# Altium footprint library FootprintSMD.PcbLib: 140 footprints (part 5 of 9)
Each footprint in its own frame and in the unit in brackets; x right, y up, seen from the top. Pads: shape width x height; smd on the part's side, far side on the other; paste and mask are expansions set on the pad; w line width, h text height; cw(c..) or ccw(c..) is an arc to the next point about the centre after c.
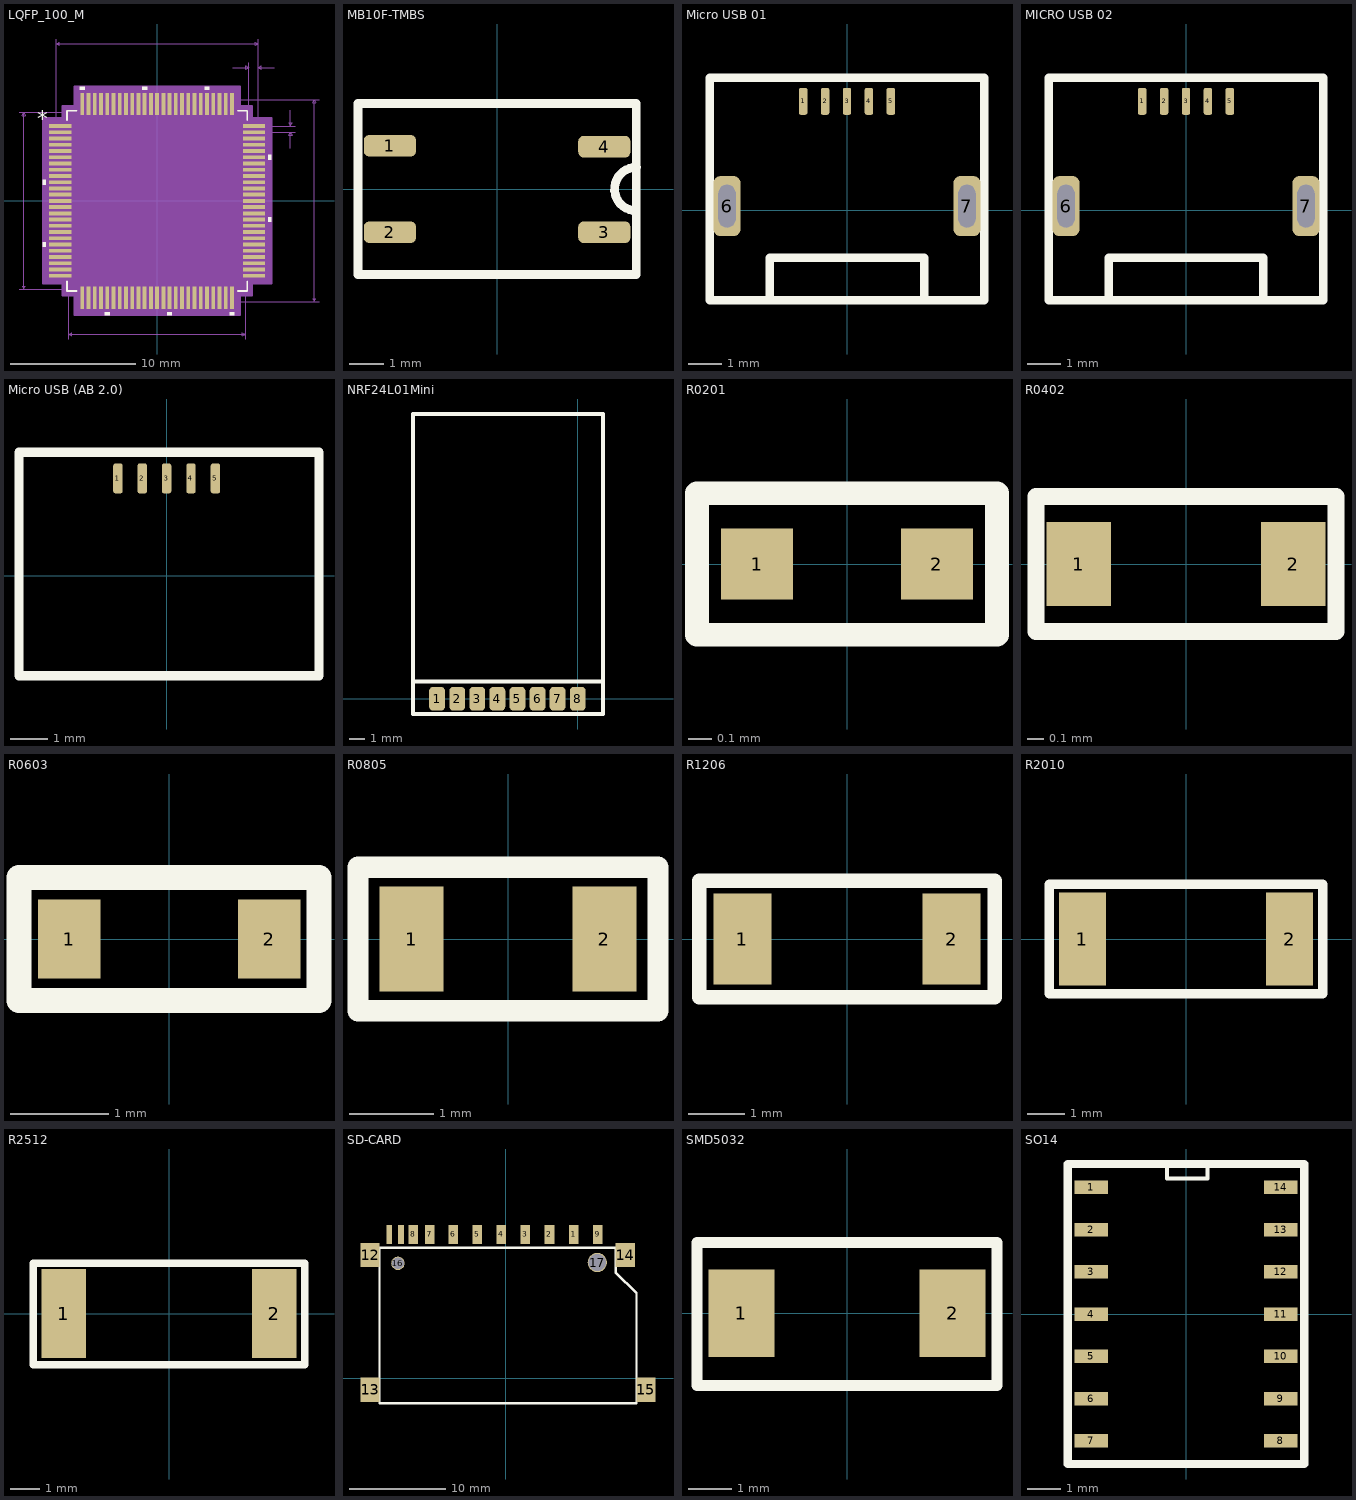
[diagram p4: the footprints below, top view; thin cyan lines are the x and y axes]

## LQFP_100_M [mil]
pads (100):
  rect 70x12 smd paste+0 mask+0: 1(-306,236.22) 2(-306,216.54) 3(-306,196.85) 4(-306,177.17) 5(-306,157.48) 6(-306,137.8) 7(-306,118.11) 8(-306,98.43) 9(-306,78.74) 10(-306,59.06) 11(-306,39.37) 12(-306,19.69) 13(-306,0) 14(-306,-19.68) 15(-306,-39.37) 16(-306,-59.06) 17(-306,-78.74) 18(-306,-98.43) 19(-306,-118.11) 20(-306,-137.8) 21(-306,-157.48) 22(-306,-177.17) 23(-306,-196.85) 24(-306,-216.54) 25(-306,-236.22) 51(306,-236.22) 52(306,-216.54) 53(306,-196.85) 54(306,-177.17) 55(306,-157.48) 56(306,-137.8) 57(306,-118.11) 58(306,-98.43) 59(306,-78.74) 60(306,-59.06) 61(306,-39.37) 62(306,-19.68) 63(306,0) 64(306,19.68) 65(306,39.37) 66(306,59.06) 67(306,78.74) 68(306,98.43) 69(306,118.11) 70(306,137.8) 71(306,157.48) 72(306,177.17) 73(306,196.85) 74(306,216.54) 75(306,236.22)
  rect 12x70 smd paste+0 mask+0: 26(-236.22,-306) 27(-216.54,-306) 28(-196.85,-306) 29(-177.17,-306) 30(-157.48,-306) 31(-137.8,-306) 32(-118.11,-306) 33(-98.43,-306) 34(-78.74,-306) 35(-59.06,-306) 36(-39.37,-306) 37(-19.68,-306) 38(0,-306) 39(19.68,-306) 40(39.37,-306) 41(59.06,-306) 42(78.74,-306) 43(98.43,-306) 44(118.11,-306) 45(137.8,-306) 46(157.48,-306) 47(177.17,-306) 48(196.85,-306) 49(216.54,-306) 50(236.22,-306) 76(236.22,306) 77(216.54,306) 78(196.85,306) 79(177.17,306) 80(157.48,306) 81(137.8,306) 82(118.11,306) 83(98.43,306) 84(78.74,306) 85(59.06,306) 86(39.37,306) 87(19.68,306) 88(0,306) 89(-19.68,306) 90(-39.37,306) 91(-59.06,306) 92(-78.74,306) 93(-98.43,306) 94(-118.11,306) 95(-137.8,306) 96(-157.48,306) 97(-177.17,306) 98(-196.85,306) 99(-216.54,306) 100(-236.22,306)
Top Overlay:
  region: -228.72,351 -243.72,351 -243.72,361 -228.72,361
  region: -31.87,351 -46.87,351 -46.87,361 -31.87,361
  region: 164.98,351 149.98,351 149.98,361 164.98,361
  region: 351,145.3 361,145.3 361,130.3 351,130.3
  region: 351,-51.56 361,-51.56 361,-66.56 351,-66.56
  region: 243.72,-351 228.72,-351 228.72,-361 243.72,-361
  region: 46.87,-351 31.87,-351 31.87,-361 46.87,-361
  region: -149.98,-351 -164.98,-351 -164.98,-361 -149.98,-361
  region: -351,-130.3 -361,-130.3 -361,-145.3 -351,-145.3
  region: -351,66.56 -361,66.56 -361,51.56 -351,51.56
  lines w6: -284.5,-254.82 -284.5,-284.5 -254.82,-284.5 ; -284.5,254.82 -284.5,284.5 -254.82,284.5 ; 254.82,-284.5 284.5,-284.5 284.5,-254.82 ; 254.82,284.5 284.5,284.5 284.5,254.82
  text "*" at -378.5,236.06 h50
Mechanical 7:
  lines w1: -436,-279.5 -236.22,-279.5 ; -436,279.5 -236.22,279.5 ; -319,236.22 -319,511 ; -279.5,-436 -279.5,-236.22 ; 236.22,-319 511,-319 ; 236.22,319 511,319 ; 239,421 289,421 ; 279.5,-436 279.5,-236.22 ; 289,236.22 289,436 ; 306,216.54 436,216.54 ; 306,236.22 436,236.22 ; 319,436 319,236.22 319,511 ; 369,421 319,421 ; 421,166.54 421,216.54 ; 421,286.22 421,236.22 ; -421,-279.5 -416,-269.5 -426,-269.5 -421,-279.5 ; -421,-279.5 -421,279.5 ; -421,279.5 -416,269.5 -426,269.5 -421,279.5 ; -319,496 -309,491 -309,501 -319,496 ; -319,496 319,496 ; -279.5,-421 -269.5,-426 -269.5,-416 -279.5,-421 ; -279.5,-421 279.5,-421 ; 279.5,-421 269.5,-426 269.5,-416 279.5,-421 ; 289,421 279,416 279,426 289,421 ; 319,421 329,416 329,426 319,421 ; 319,496 309,491 309,501 319,496 ; 421,216.54 426,206.54 416,206.54 421,216.54 ; 421,236.22 426,246.22 416,246.22 421,236.22 ; 496,-319 501,-309 491,-309 496,-319 ; 496,-319 496,319 ; 496,319 501,309 491,309 496,319
  text "0.638in/16.205mm" at 516,-12.5 h25
  text "0.559in/14.199mm" at -641,-12.5 h25
  text "0.559in/14.199mm" at -100,-466 h25
  text "0.638in/16.205mm" at -100,516 h25
  text "0.03in/0.762mm" at 216.5,441 h25
  text "0.02in/0.5mm" at 441,213.88 h25
Mechanical 13:
  drawing of 405 lines, arcs and shapes, not listed
  text "*" at -277,221.06 h50
Mechanical 15:
  region: -261.72,-299.5 -299.5,-299.5 -299.5,-261.72 -361,-261.72 -361,261.72 -299.5,261.72 -299.5,299.5 -261.72,299.5 -261.72,361 261.72,361 261.72,299.5 299.5,299.5 299.5,261.72 361,261.72 361,-261.72 299.5,-261.72 299.5,-299.5 261.72,-299.5 261.72,-361 -261.72,-361
  lines w6: -361,-261.72 -361,261.72 -299.5,261.72 -299.5,299.5 -261.72,299.5 -261.72,361 261.72,361 261.72,299.5 299.5,299.5 299.5,261.72 361,261.72 361,-261.72 299.5,-261.72 299.5,-299.5 261.72,-299.5 261.72,-361 -261.72,-361 -261.72,-299.5 -299.5,-299.5 -299.5,-261.72 -361,-261.72
3D body: height 10, standoff 0, extent 0,0 10,10
3D body "LQFP-100-M.step": height 63.11, standoff 0, extent -319.01,-319.01 319.02,319.02

## MB10F-TMBS [mil]
pads (4):
  rrect50% 60x25 smd: 1(-123.28,49.7) 2(-123.28,-49.7) 3(123.28,-49.7) 4(123.28,48.72)
Top Overlay:
  lines w10: 160,-25 cw(c160,0) 160.28,25 ; -160,-98.43 -160,98.43 160,98.43 160,-98.43 -160,-98.43
3D body "User Library-MB10F TMBS.STEP": height 63.39, standoff 0, extent -133.91,-96.95 133.81,95.97

## Micro USB 01 [mm]
pads (7):
  rrect50% 0.25x0.8 smd: 1(-1.3,3.235) 2(-0.65,3.235) 3(0,3.235) 4(0.65,3.235) 5(1.3,3.235)
  rrect50% 0.8x1.779 hole 0.508 slot 1.27 at 90 deg: 6(-3.556,0.127) 7(3.556,0.127)
Top Overlay:
  lines w0.254: -2.286,-2.667 -2.286,-1.397 2.286,-1.397 2.286,-2.54 ; -4.064,-2.667 -4.064,3.937 4.064,3.937 4.064,-2.667 -4.064,-2.667
3D body "u254-051t-4bh23-s2s.stp": height 2.68, standoff -1.1, extent -4,-2.682 4,3.368

## MICRO USB 02 [mm]
pads (7):
  rrect50% 0.25x0.8 smd: 1(-1.3,3.235) 2(-0.65,3.235) 3(0,3.235) 4(0.65,3.235) 5(1.3,3.235)
  rrect50% 0.8x1.779 hole 0.508 slot 1.27 at 90 deg: 6(-3.556,0.127) 7(3.556,0.127)
Top Overlay:
  lines w0.254: -2.286,-2.667 -2.286,-1.397 2.286,-1.397 2.286,-2.54 ; -4.064,-2.667 -4.064,3.937 4.064,3.937 4.064,-2.667 -4.064,-2.667
3D body "User Library-u-f-m5dd-y-l.STEP": height 314.84, standoff 308.97, extent -2756.607,5.435 -2748.287,9.225
3D body "User Library-u-f-m5ds-y-1.STEP": height 315.45, standoff 309.71, extent -2703.432,5.114 -2695.206,8.624

## Micro USB (AB 2.0) [mm]
pads (5):
  rrect50% 0.25x0.8 smd: 1(-1.3,2.6) 2(-0.65,2.6) 3(0,2.6) 4(0.65,2.6) 5(1.3,2.6)
Top Overlay:
  lines w0.25: -3.937,-2.667 -3.937,3.302 4.064,3.302 4.064,-2.667 -3.937,-2.667
3D body "micro_usb_47346-0001.STEP": height 2.72, standoff -0.22, extent -3.99,-2.66 3.99,2.77

## NRF24L01Mini [mm]
pads (8):
  rrect50% 1x1.5 smd: 1(-8.89,0) 2(-7.62,0) 3(-6.35,0) 4(-5.08,0) 5(-3.81,0) 6(-2.54,0) 7(-1.27,0) 8(0,0)
Top Overlay:
  lines w0.25: -10.414,-0.965 1.6,-0.965 1.6,18 ; -10.414,1.092 1.575,1.092
  lines w0.254: -10.414,-0.965 -10.414,18 1.6,18
3D body "User Library-nRF24L01-Mini.STEP": height 0.8, standoff 0, extent -10.42,0 1.58,18

## R0201 [mil]
pads (2):
  rect 12x11.81 smd: 1(-15,0) 2(15,0)
Top Overlay:
  lines w3.94: -25,-11.81 25,-11.81 25,11.81 -25,11.81 -25,-11.81
3D body "R0201.step": height 9.06, standoff 0, extent -11.81,-5.9 11.82,5.91

## R0402 [mil]
pads (2):
  rect 15x19.68 smd: 1(-25,0) 2(25,0)
Top Overlay:
  lines w3.94: -35,-15.75 -35,15.75 35,15.75 35,-15.75 -35,-15.75
3D body "R0402.step": height 12.6, standoff 0, extent -19.68,-9.84 19.69,9.85

## R0603 [mil]
pads (2):
  rect 25x31.5 smd: 1(-40,0) 2(40,0)
Top Overlay:
  lines w10: -60,-24.61 60,-24.61 60,24.61 -60,24.61 -60,-24.61
3D body "R0603.step": height 17.72, standoff 0, extent -31.49,-15.74 31.5,15.75

## R0805 [mil]
pads (2):
  rect 30x48.82 smd: 1(-45,0) 2(45,0)
Top Overlay:
  lines w10: -70,-33.46 70,-33.46 70,33.46 -70,33.46 -70,-33.46
3D body "User Library-RESC2012X05N.STEP": height 17.76, standoff 0, extent -38.74,-24.6 40,24.6

## R1206 [mil]
pads (2):
  rect 40x62.99 smd: 1(-72.5,0) 2(72.5,0)
Top Overlay:
  lines w10: -102.5,-40.35 -102.5,40.35 102.5,40.35 102.5,-40.35 -102.5,-40.35
3D body "R1206.step": height 21.65, standoff 0, extent -61.51,-31.49 60.54,31.5

## R2010 [mil]
pads (2):
  rect 50x98.43 smd: 1(-110,0) 2(110,0)
Top Overlay:
  lines w10: -145,-58 -145,58.07 145,58.07 145,-58 -145,-58
3D body "SMD2010.STEP": height 22.05, standoff 0, extent -98.42,-49.21 98.43,49.21

## R2512 [mm]
pads (2):
  rect 1.5x3 smd: 1(-3.556,0) 2(3.556,0)
Top Overlay:
  lines w0.254: -4.572,-1.725 -4.572,1.7 4.572,1.7 4.572,-1.725 -4.572,-1.725
3D body "SMD2512.STEP": height 0.59, standoff -0.01, extent -3.15,-1.6 3.15,1.55

## SD-CARD [mm]
pads (17):
  rect 1x2 smd: 1(7.057,14.947) 2(4.557,14.947) 3(2.057,14.947) 4(-0.443,14.947) 5(-2.943,14.947) 6(-5.443,14.947) 7(-7.868,14.947) 8(-9.568,14.947) 9(9.557,14.947)
  rect 0.6x2 smd: 10(-10.868,14.947) 11(-12.068,14.947)
  rect 2x2.5 smd: 12(-14.068,12.788) 13(-14.068,-1.182) 14(12.411,12.788) 15(14.57,-1.182)
  round 1.4 hole 1.2: 16(-11.168,11.947)
  round 2 hole 1.8: 17(9.522,12.026)
Top Overlay:
  lines w0.254: -13.084,-2.579 13.586,-2.579 13.586,8.851 11.427,11.01 11.427,13.55 -13.084,13.55 -13.084,-2.579
3D body "User Library-SD Kart.step": height 3, standoff -1, extent -14.151,-15.256 14.449,14.744

## SMD5032 [mm]
pads (2):
  rect 1.5x2 smd: 1(-2.413,0) 2(2.413,0)
Top Overlay:
  lines w0.254: -3.429,-1.65 3.429,-1.65 3.429,1.625 -3.429,1.625 -3.429,-1.65
3D body "User Library-5032_2.STEP": height 1.2, standoff -0.01, extent -2.503,-1.603 2.497,1.597

## SO14 [mil]
pads (14):
  rect 40x16 smd: 1(-112.11,150) 2(-112.11,100) 3(-112.11,50) 4(-112.11,0) 5(-112.11,-50) 6(-112.11,-100) 7(-112.11,-150) 8(112.11,-150) 9(112.11,-100) 10(112.11,-50) 11(112.11,0) 12(112.11,50) 13(112.11,100) 14(112.11,150)
Top Overlay:
  lines w4.72: -22.44,177.75 -22.44,160.75 25.56,160.75 25.56,177.75
  lines w10: -140,-177.25 140,-177.25 140,177.75 -140,177.75 -140,-177.25
3D body "SW3DPS-SO-14 (PIC16F684)-DEFAULT.STEP": height 62.99, standoff 0, extent -118.41,-171.05 117.42,171.07